# Altium footprint library 3D_MIG_Controller.PCBLIB: 560 footprints (part 14 of 35)
Each footprint in its own frame and in the unit in brackets; x right, y up, seen from the top. Pads: shape width x height; smd on the part's side, far side on the other; paste and mask are expansions set on the pad; w line width, h text height; cw(c..) or ccw(c..) is an arc to the next point about the centre after c.
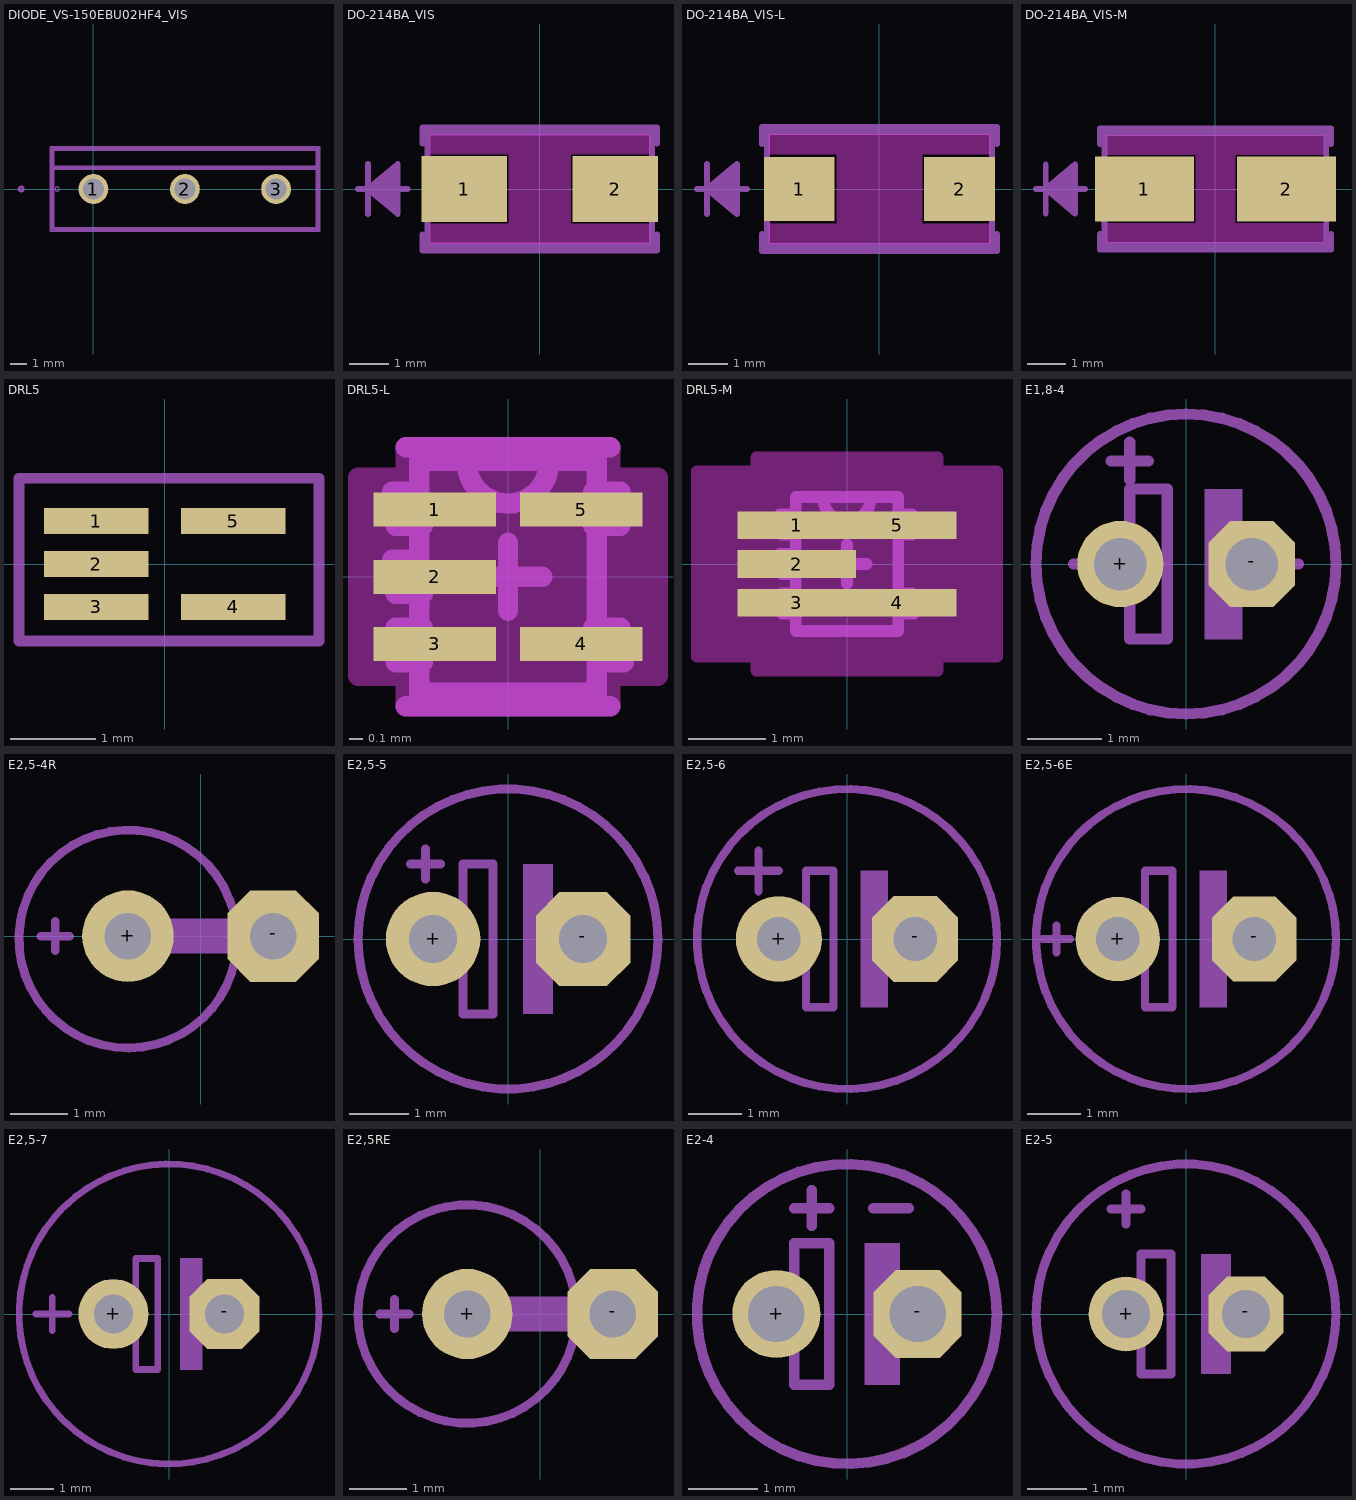
[diagram p13: the footprints below, top view; thin cyan lines are the x and y axes]

## DIODE_VS-150EBU02HF4_VIS [mil]
pads (3):
  round 70 hole 50: 1(0,0) 2(215,0) 3(429,0)
tDocu:
  lines w0: -90,0 ccw(c-85,0) -80,0 ; -90,0 cw(c-85,0) -80,0 ; -90,0 ccw(c-85,0) -80,0 ; -90,0 cw(c-85,0) -80,0 ; -90,0 ccw(c-85,0) -80,0 ; -90,0 cw(c-85,0) -80,0
  lines w6: -95,48 -95,-92 525,-92 525,48 ; -95,48 525,48 ; -95,48 -95,92 525,92 525,48
  text "TAB" at 181,58 h38.75
  text "TAB" at 181,58 h38.75
  text "TAB" at 181,58 h38.75
tPlace:
  lines w6: -95,52 525,52 ; -175,0 ccw(c-170,0) -165,0 ; -175,0 cw(c-170,0) -165,0 ; -175,0 ccw(c-170,0) -165,0 ; -175,0 cw(c-170,0) -165,0 ; -175,0 ccw(c-170,0) -165,0 ; -175,0 cw(c-170,0) -165,0 ; -100,-98 530,-98 530,98 -100,98 -100,-98

## DO-214BA_VIS [mil]
pads (2):
  rect 86x66 smd: 1(-76,0) 2(76,0)
Top keep-out:
  region: -31,35 31,35 31,-35 -31,-35
  region: -111,55 111,55 111,35 -111,35
  region: -111,-35 111,-35 111,-55 -111,-55
tDocu:
  lines w6: -183,0 -173,0 ; -173,-25 -173,0 ; -173,25 -173,0 ; -143,-20 -173,0 ; -143,-15 -173,0 ; -143,-10 -173,0 ; -143,-5 -173,0 ; -143,5 -173,0 ; -143,10 -173,0 ; -143,15 -173,0 ; -143,20 -173,0 ; -133,0 -173,0 ; -173,0 -143,25 -143,-25 -173,0 ; -113,-57 113,-57 113,57 -113,57 -113,-57
tPlace:
  lines w6: -183,0 -173,0 ; -173,-25 -173,0 ; -173,25 -173,0 ; -143,-20 -173,0 ; -143,-15 -173,0 ; -143,-10 -173,0 ; -143,-5 -173,0 ; -143,5 -173,0 ; -143,10 -173,0 ; -143,15 -173,0 ; -143,20 -173,0 ; -133,0 -173,0 ; -118,-46 -118,-62 118,-62 118,-46 ; -118,46 -118,62 118,62 118,46 ; -173,0 -143,25 -143,-25 -173,0

## DO-214BA_VIS-L [mil]
pads (2):
  rect 71x64 smd: 1(-80.5,0) 2(80.5,0)
Top keep-out:
  region: -43,35 43,35 43,-35 -43,-35
  region: -111,55 111,55 111,35 -111,35
  region: -111,-35 111,-35 111,-55 -111,-55
tDocu:
  lines w6: -183,0 -173,0 ; -173,-25 -173,0 ; -173,25 -173,0 ; -143,-20 -173,0 ; -143,-15 -173,0 ; -143,-10 -173,0 ; -143,-5 -173,0 ; -143,5 -173,0 ; -143,10 -173,0 ; -143,15 -173,0 ; -143,20 -173,0 ; -133,0 -173,0 ; -173,0 -143,25 -143,-25 -173,0 ; -113,-57 113,-57 113,57 -113,57 -113,-57
tPlace:
  lines w6: -183,0 -173,0 ; -173,-25 -173,0 ; -173,25 -173,0 ; -143,-20 -173,0 ; -143,-15 -173,0 ; -143,-10 -173,0 ; -143,-5 -173,0 ; -143,5 -173,0 ; -143,10 -173,0 ; -143,15 -173,0 ; -143,20 -173,0 ; -133,0 -173,0 ; -118,-45 -118,-62 118,-62 118,-45 ; -118,45 -118,62 118,62 118,45 ; -173,0 -143,25 -143,-25 -173,0

## DO-214BA_VIS-M [mil]
pads (2):
  rect 101x66 smd: 1(-72.5,0) 2(72.5,0)
Top keep-out:
  region: -20,35 20,35 20,-35 -20,-35
  region: -111,55 111,55 111,35 -111,35
  region: -111,-35 111,-35 111,-55 -111,-55
tDocu:
  lines w6: -183,0 -173,0 ; -173,-25 -173,0 ; -173,25 -173,0 ; -143,-20 -173,0 ; -143,-15 -173,0 ; -143,-10 -173,0 ; -143,-5 -173,0 ; -143,5 -173,0 ; -143,10 -173,0 ; -143,15 -173,0 ; -143,20 -173,0 ; -133,0 -173,0 ; -173,0 -143,25 -143,-25 -173,0 ; -113,-57 113,-57 113,57 -113,57 -113,-57
tPlace:
  lines w6: -183,0 -173,0 ; -173,-25 -173,0 ; -173,25 -173,0 ; -143,-20 -173,0 ; -143,-15 -173,0 ; -143,-10 -173,0 ; -143,-5 -173,0 ; -143,5 -173,0 ; -143,10 -173,0 ; -143,15 -173,0 ; -143,20 -173,0 ; -136,0 -173,0 ; -118,-46 -118,-62 118,-62 118,-46 ; -118,46 -118,62 118,62 118,46 ; -173,0 -143,25 -143,-25 -173,0

## DRL5 [mil]
pads (5):
  rect 48x12 smd paste+0 mask+0: 1(-31.5,19.69) 2(-31.5,0) 3(-31.5,-19.69) 4(31.5,-19.69) 5(31.5,19.69)
tPlace:
  lines w5: -66.93,-35.43 -66.93,39.37 70.87,39.37 70.87,-35.43 -66.93,-35.43

## DRL5-L [mil]
pads (5):
  rect 36x10 smd: 1(-21.5,19.69) 2(-21.5,0) 3(-21.5,-19.69) 4(21.5,-19.69) 5(21.5,19.69)
Top keep-out:
  region: -29.5,-37.5 -29.5,-28.69 -43.5,-28.69 -43.5,28.69 -29.5,28.69 -29.5,37.5 29.5,37.5 29.5,28.69 43.5,28.69 43.5,-28.69 29.5,-28.69 29.5,-37.5
  lines w6: -44,-29 -30,-29 -30,-38 30,-38 30,-29 44,-29 44,29 30,29 30,38 -30,38 -30,29 -44,29 -44,-29
tDocu:
  lines w6: -12,33 ccw(c0,33.5) 12,34 ; -26,5 -26,25 ; -26,5 -26,-34 26,-34 26,-25 ; -26,5 -25,-5 -33,-5 -34,5 -26,5 ; -26,25 -26,34 12,34 ; -26,25 -25,15 -33,15 -34,25 -26,25 ; 12,34 26,34 26,-25 ; 26,-25 25,-15 33,-15 34,-25 26,-25 ; -33,-25 -33,-15 -25,-15 -25,-25 -33,-25 ; 25,15 25,25 33,25 33,15 25,15
  text "*" at -38,-13 h77.5
tPlace:
  lines w6: -30,-38 30,-38 ; -30,38 30,38
  text "*" at -54,25 h62
tOrigins:
  lines w6: -10,0 10,0 ; 0,-10 0,10

## DRL5-M [mil]
pads (5):
  rect 60x14 smd: 1(-25.5,19.69) 2(-25.5,0) 3(-25.5,-19.69) 4(25.5,-19.69) 5(25.5,19.69)
Top keep-out:
  region: -45.5,-53.5 -45.5,-46.69 -75.5,-46.69 -75.5,46.69 -45.5,46.69 -45.5,53.5 45.5,53.5 45.5,46.69 75.5,46.69 75.5,-46.69 45.5,-46.69 45.5,-53.5
  lines w6: -76,-47 -46,-47 -46,-54 46,-54 46,-47 76,-47 76,47 46,47 46,54 -46,54 -46,47 -76,47 -76,-47
tDocu:
  lines w6: -12,33 ccw(c0,33.5) 12,34 ; -26,5 -26,25 ; -26,5 -26,-34 26,-34 26,-25 ; -26,5 -25,-5 -33,-5 -34,5 -26,5 ; -26,25 -26,34 12,34 ; -26,25 -25,15 -33,15 -34,25 -26,25 ; 12,34 26,34 26,-25 ; 26,-25 25,-15 33,-15 34,-25 26,-25 ; -33,-25 -33,-15 -25,-15 -25,-25 -33,-25 ; 25,15 25,25 33,25 33,15 25,15
  text "*" at -38,-9 h77.5
tPlace:
  text "*" at -58,29 h62
tOrigins:
  lines w6: -10,0 10,0 ; 0,-10 0,10

## E1,8-4 [mil]
pads (2):
  round 46 hole 28: +(-35,0)
  oct 46x46 / inner round 42.5 / far side oct 46x46 hole 28: -(35,0)
tDocu:
  region: 10,-40 10,40 30,40 30,-40
  lines w6: -60,0 -30,0 ; 25,0 60,0 ; -30,0 -30,-40 -10,-40 -10,40 -30,40 -30,0
tPlace:
  circle w6: c0,0 r80
  lines w6: -40,55 -20,55 ; -30,45 -30,65

## E2,5-4R [mil]
pads (2):
  round 63 hole 32: +(-50,0)
  oct 63x63 / inner round 58.2 / far side oct 63x63 hole 32: -(50,0)
tDocu:
  lines w6: 20,25 cw(c-50,-1.99) 21.27,-25.42
  lines w24: -50,0 50,0
tPlace:
  lines w6: -110,0 -90,0 ; -100,-10 -100,10 ; 20,25 ccw(c-50,-1.99) 21.27,-25.42
  lines w24: -5,0 3,0

## E2,5-5 [mil]
pads (2):
  round 63 hole 32: +(-50,0)
  oct 63x63 / inner round 58.2 / far side oct 63x63 hole 32: -(50,0)
tDocu:
  region: 10,-50 10,50 30,50 30,-50
  lines w6: -65,0 -30,0 ; 25,0 65,0 ; -30,0 -30,-50 -10,-50 -10,50 -30,50 -30,0
tPlace:
  circle w6: c0,0 r100
  lines w6: -65,50 -55,50 ; -55,40 -55,50 ; -55,60 -55,50 ; -45,50 -55,50

## E2,5-6 [mil]
pads (2):
  round 63 hole 32: +(-50,0)
  oct 63x63 / inner round 58.2 / far side oct 63x63 hole 32: -(50,0)
tDocu:
  region: 10,-50 10,50 30,50 30,-50
  lines w6: -65,0 -30,0 ; 25,0 65,0 ; -30,0 -30,-50 -10,-50 -10,50 -30,50 -30,0
tPlace:
  circle w6: c0,0 r110
  lines w6: -80,50 -65,50 ; -65,35 -65,50 ; -65,65 -65,50 ; -50,50 -65,50

## E2,5-6E [mil]
pads (2):
  round 62 hole 32: +(-50,0)
  oct 62x62 / inner round 57.28 / far side oct 62x62 hole 32: -(50,0)
tDocu:
  region: 10,-50 10,50 30,50 30,-50
  lines w6: -65,0 -30,0 ; 25,0 65,0 ; -30,0 -30,-50 -10,-50 -10,50 -30,50 -30,0
tPlace:
  circle w6: c0,0 r110
  lines w6: -105,0 -85,0 ; -95,-10 -95,10

## E2,5-7 [mil]
pads (2):
  round 63 hole 35.43: +(-50,0)
  oct 63x63 / inner round 58.2 / far side oct 63x63 hole 35.43: -(50,0)
tDocu:
  region: 10,-50 10,50 30,50 30,-50
  lines w6: -65,0 -30,0 ; 25,0 65,0 ; -30,0 -30,-50 -10,-50 -10,50 -30,50 -30,0
tPlace:
  circle w6: c0,0 r135
  lines w6: -120,0 -90,0 ; -105,-15 -105,15

## E2,5RE [mil]
pads (2):
  round 62 hole 32: +(-50,0)
  oct 62x62 / inner round 57.28 / far side oct 62x62 hole 32: -(50,0)
tDocu:
  lines w6: 10,-45 ccw(c-50,0) 10,45
  lines w24: -50,0 50,0
tPlace:
  lines w6: -110,0 -90,0 ; -100,-10 -100,10 ; 10,-45 cw(c-50,0) 10,45
  lines w24: -5,0 3,0

## E2-4 [mil]
pads (2):
  round 50 hole 32: +(-40,0)
  oct 50x50 / inner round 46.19 / far side oct 50x50 hole 32: -(40,0)
tDocu:
  region: 10,-40 10,40 30,40 30,-40
  lines w6: -60,0 -30,0 ; 25,0 60,0 ; -30,0 -30,-40 -10,-40 -10,40 -30,40 -30,0
tPlace:
  circle w6: c0,0 r85
  lines w6: -30,60 -10,60 ; -20,50 -20,70 ; 15,60 35,60

## E2-5 [mil]
pads (2):
  round 50 hole 32: +(-40,0)
  oct 50x50 / inner round 46.19 / far side oct 50x50 hole 32: -(40,0)
tDocu:
  region: 10,-40 10,40 30,40 30,-40
  lines w6: -60,0 -30,0 ; 25,0 60,0 ; -30,0 -30,-40 -10,-40 -10,40 -30,40 -30,0
tPlace:
  circle w6: c0,0 r100
  lines w6: -50,70 -30,70 ; -40,60 -40,80